# Altium integrated library WCAP-FTXX_rev15a.intlib: 100 symbols (continued)
## WCAP-FTXX 15x18x12x6 890334025022
designator C?, comment 150000 pF
WCAP-FTXX Film Capacitors, C=150000 pF; Manufacturer: Wurth Elektronik; partNo: 890334025022; E-mail: libraries@we-online.com; ComponentLink1Description: Manufacturer; ComponentLink1URL: http://www.we-online.com; ComponentLink2Description: Datasheet; ComponentLink2URL: http://katalog.we-online.de/pbs/datasheet/890334025022.pdf; Created by: Karrer Zheng; Created Date: 3/2/2015; Capacitance: 150000 pF
footprint WCAP-FTXX 15x18x12x6
pins: 1  , 2  

## WCAP-FTXX 15x18x12x6 890334025025
designator C?, comment 180000 pF
WCAP-FTXX Film Capacitors, C=180000 pF; Manufacturer: Wurth Elektronik; partNo: 890334025025; E-mail: libraries@we-online.com; ComponentLink1Description: Manufacturer; ComponentLink1URL: http://www.we-online.com; ComponentLink2Description: Datasheet; ComponentLink2URL: http://katalog.we-online.de/pbs/datasheet/890334025025.pdf; Created by: Karrer Zheng; Created Date: 3/2/2015; Capacitance: 180000 pF
footprint WCAP-FTXX 15x18x12x6
pins: 1  , 2  

## WCAP-FTXX 15x18x13,5x7,5 890334025020
designator C?, comment 120000 pF
WCAP-FTXX Film Capacitors, C=120000 pF; Manufacturer: Wurth Elektronik; partNo: 890334025020; E-mail: libraries@we-online.com; ComponentLink1Description: Manufacturer; ComponentLink1URL: http://www.we-online.com; ComponentLink2Description: Datasheet; ComponentLink2URL: http://katalog.we-online.de/pbs/datasheet/890334025020.pdf; Created by: Karrer Zheng; Created Date: 3/2/2015; Capacitance: 120000 pF
footprint WCAP-FTXX 15x18x13,5x7,5
pins: 1  , 2  

## WCAP-FTXX 15x18x14,5x7,5 890334025031
designator C?, comment 270000 pF
WCAP-FTXX Film Capacitors, C=270000 pF; Manufacturer: Wurth Elektronik; partNo: 890334025031; E-mail: libraries@we-online.com; ComponentLink1Description: Manufacturer; ComponentLink1URL: http://www.we-online.com; ComponentLink2Description: Datasheet; ComponentLink2URL: http://katalog.we-online.de/pbs/datasheet/890334025031.pdf; Created by: Karrer Zheng; Created Date: 3/2/2015; Capacitance: 270000 pF
footprint WCAP-FTXX 15x18x14,5x7,5
pins: 1  , 2  

## WCAP-FTXX 15x18x14,5x8,5 890334025034
designator C?, comment 330000 pF
WCAP-FTXX Film Capacitors, C=330000 pF; Manufacturer: Wurth Elektronik; partNo: 890334025034; E-mail: libraries@we-online.com; ComponentLink1Description: Manufacturer; ComponentLink1URL: http://www.we-online.com; ComponentLink2Description: Datasheet; ComponentLink2URL: http://katalog.we-online.de/pbs/datasheet/890334025034.pdf; Created by: Karrer Zheng; Created Date: 3/2/2015; Capacitance: 330000 pF
footprint WCAP-FTXX 15x18x14,5x8,5
pins: 1  , 2  

## WCAP-FTXX 15x18x14x8 890334025039
designator C?, comment 470000 pF
WCAP-FTXX Film Capacitors, C=470000 pF; Manufacturer: Wurth Elektronik; partNo: 890334025039; E-mail: libraries@we-online.com; ComponentLink1Description: Manufacturer; ComponentLink1URL: http://www.we-online.com; ComponentLink2Description: Datasheet; ComponentLink2URL: http://katalog.we-online.de/pbs/datasheet/890334025039.pdf; Created by: Karrer Zheng; Created Date: 3/2/2015; Capacitance: 470000 pF
footprint WCAP-FTXX 15x18x14x8
pins: 1  , 2  

## WCAP-FTXX 15x18x15x9 890334025043
designator C?, comment 560000 pF
WCAP-FTXX Film Capacitors, C=560000 pF; Manufacturer: Wurth Elektronik; partNo: 890334025043; E-mail: libraries@we-online.com; ComponentLink1Description: Manufacturer; ComponentLink1URL: http://www.we-online.com; ComponentLink2Description: Datasheet; ComponentLink2URL: http://katalog.we-online.de/pbs/datasheet/890334025043.pdf; Created by: Karrer Zheng; Created Date: 3/2/2015; Capacitance: 560000 pF
footprint WCAP-FTXX 15x18x15x9
pins: 1  , 2  

## WCAP-FTXX 15x18x16x10 890334025045
designator C?, comment 680000 pF
WCAP-FTXX Film Capacitors, C=680000 pF; Manufacturer: Wurth Elektronik; partNo: 890334025045; E-mail: libraries@we-online.com; ComponentLink1Description: Manufacturer; ComponentLink1URL: http://www.we-online.com; ComponentLink2Description: Datasheet; ComponentLink2URL: http://katalog.we-online.de/pbs/datasheet/890334025045.pdf; Created by: Karrer Zheng; Created Date: 3/2/2015; Capacitance: 680000 pF
footprint WCAP-FTXX 15x18x16x10
pins: 1  , 2  


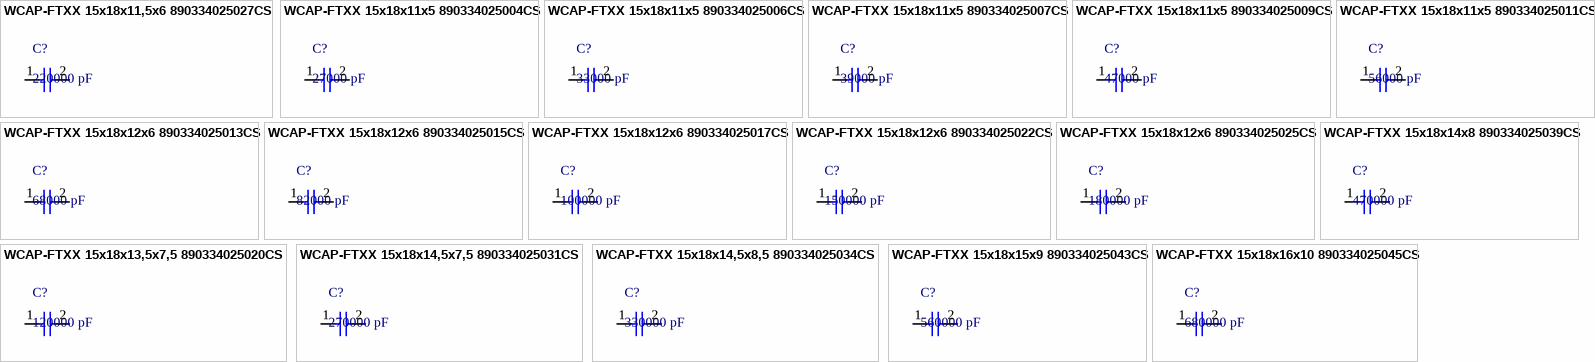
[diagram p5: symbols WCAP-FTXX 15x18x11,5x6 890334025027CS to WCAP-FTXX 15x18x16x10 890334025045CS]

## WCAP-FTXX 15x18x11,5x6 890334025027CS
designator C?, comment 220000 pF
WCAP-FTXX Film Capacitors, C=220000 pF; Manufacturer: Wurth Elektronik; partNo: 890334025027CS; E-mail: libraries@we-online.com; ComponentLink1Description: Manufacturer; ComponentLink1URL: http://www.we-online.com; ComponentLink2Description: Datasheet; ComponentLink2URL: http://katalog.we-online.de/pbs/datasheet/890334025027CS.pdf; Created by: Karrer Zheng; Created Date: 3/2/2015; Capacitance: 220000 pF
footprint WCAP-FTXX 15x18x11,5x6x4
pins: 1  , 2  

## WCAP-FTXX 15x18x11x5 890334025004CS
designator C?, comment 27000 pF
WCAP-FTXX Film Capacitors, C=27000 pF; Manufacturer: Wurth Elektronik; partNo: 890334025004CS; E-mail: libraries@we-online.com; ComponentLink1Description: Manufacturer; ComponentLink1URL: http://www.we-online.com; ComponentLink2Description: Datasheet; ComponentLink2URL: http://katalog.we-online.de/pbs/datasheet/890334025004CS.pdf; Created by: Karrer Zheng; Created Date: 3/2/2015; Capacitance: 27000 pF
footprint WCAP-FTXX 15x18x11x5x4
pins: 1  , 2  

## WCAP-FTXX 15x18x11x5 890334025006CS
designator C?, comment 33000 pF
WCAP-FTXX Film Capacitors, C=33000 pF; Manufacturer: Wurth Elektronik; partNo: 890334025006CS; E-mail: libraries@we-online.com; ComponentLink1Description: Manufacturer; ComponentLink1URL: http://www.we-online.com; ComponentLink2Description: Datasheet; ComponentLink2URL: http://katalog.we-online.de/pbs/datasheet/890334025006CS.pdf; Created by: Karrer Zheng; Created Date: 3/2/2015; Capacitance: 33000 pF
footprint WCAP-FTXX 15x18x11x5x4
pins: 1  , 2  

## WCAP-FTXX 15x18x11x5 890334025007CS
designator C?, comment 39000 pF
WCAP-FTXX Film Capacitors, C=39000 pF; Manufacturer: Wurth Elektronik; partNo: 890334025007CS; E-mail: libraries@we-online.com; ComponentLink1Description: Manufacturer; ComponentLink1URL: http://www.we-online.com; ComponentLink2Description: Datasheet; ComponentLink2URL: http://katalog.we-online.de/pbs/datasheet/890334025007CS.pdf; Created by: Karrer Zheng; Created Date: 3/2/2015; Capacitance: 39000 pF
footprint WCAP-FTXX 15x18x11x5x4
pins: 1  , 2  

## WCAP-FTXX 15x18x11x5 890334025009CS
designator C?, comment 47000 pF
WCAP-FTXX Film Capacitors, C=47000 pF; Manufacturer: Wurth Elektronik; partNo: 890334025009CS; E-mail: libraries@we-online.com; ComponentLink1Description: Manufacturer; ComponentLink1URL: http://www.we-online.com; ComponentLink2Description: Datasheet; ComponentLink2URL: http://katalog.we-online.de/pbs/datasheet/890334025009CS.pdf; Created by: Karrer Zheng; Created Date: 3/2/2015; Capacitance: 47000 pF
footprint WCAP-FTXX 15x18x11x5x4
pins: 1  , 2  

## WCAP-FTXX 15x18x11x5 890334025011CS
designator C?, comment 56000 pF
WCAP-FTXX Film Capacitors, C=56000 pF; Manufacturer: Wurth Elektronik; partNo: 890334025011CS; E-mail: libraries@we-online.com; ComponentLink1Description: Manufacturer; ComponentLink1URL: http://www.we-online.com; ComponentLink2Description: Datasheet; ComponentLink2URL: http://katalog.we-online.de/pbs/datasheet/890334025011CS.pdf; Created by: Karrer Zheng; Created Date: 3/2/2015; Capacitance: 56000 pF
footprint WCAP-FTXX 15x18x11x5x4
pins: 1  , 2  

## WCAP-FTXX 15x18x12x6 890334025013CS
designator C?, comment 68000 pF
WCAP-FTXX Film Capacitors, C=68000 pF; Manufacturer: Wurth Elektronik; partNo: 890334025013CS; E-mail: libraries@we-online.com; ComponentLink1Description: Manufacturer; ComponentLink1URL: http://www.we-online.com; ComponentLink2Description: Datasheet; ComponentLink2URL: http://katalog.we-online.de/pbs/datasheet/890334025013CS.pdf; Created by: Karrer Zheng; Created Date: 3/2/2015; Capacitance: 68000 pF
footprint WCAP-FTXX 15x18x12x6x4
pins: 1  , 2  

## WCAP-FTXX 15x18x12x6 890334025015CS
designator C?, comment 82000 pF
WCAP-FTXX Film Capacitors, C=82000 pF; Manufacturer: Wurth Elektronik; partNo: 890334025015CS; E-mail: libraries@we-online.com; ComponentLink1Description: Manufacturer; ComponentLink1URL: http://www.we-online.com; ComponentLink2Description: Datasheet; ComponentLink2URL: http://katalog.we-online.de/pbs/datasheet/890334025015CS.pdf; Created by: Karrer Zheng; Created Date: 3/2/2015; Capacitance: 82000 pF
footprint WCAP-FTXX 15x18x12x6x4
pins: 1  , 2  

## WCAP-FTXX 15x18x12x6 890334025017CS
designator C?, comment 100000 pF
WCAP-FTXX Film Capacitors, C=100000 pF; Manufacturer: Wurth Elektronik; partNo: 890334025017CS; E-mail: libraries@we-online.com; ComponentLink1Description: Manufacturer; ComponentLink1URL: http://www.we-online.com; ComponentLink2Description: Datasheet; ComponentLink2URL: http://katalog.we-online.de/pbs/datasheet/890334025017CS.pdf; Created by: Karrer Zheng; Created Date: 3/2/2015; Capacitance: 100000 pF
footprint WCAP-FTXX 15x18x12x6x4
pins: 1  , 2  

## WCAP-FTXX 15x18x12x6 890334025022CS
designator C?, comment 150000 pF
WCAP-FTXX Film Capacitors, C=150000 pF; Manufacturer: Wurth Elektronik; partNo: 890334025022CS; E-mail: libraries@we-online.com; ComponentLink1Description: Manufacturer; ComponentLink1URL: http://www.we-online.com; ComponentLink2Description: Datasheet; ComponentLink2URL: http://katalog.we-online.de/pbs/datasheet/890334025022CS.pdf; Created by: Karrer Zheng; Created Date: 3/2/2015; Capacitance: 150000 pF
footprint WCAP-FTXX 15x18x12x6x4
pins: 1  , 2  

## WCAP-FTXX 15x18x12x6 890334025025CS
designator C?, comment 180000 pF
WCAP-FTXX Film Capacitors, C=180000 pF; Manufacturer: Wurth Elektronik; partNo: 890334025025CS; E-mail: libraries@we-online.com; ComponentLink1Description: Manufacturer; ComponentLink1URL: http://www.we-online.com; ComponentLink2Description: Datasheet; ComponentLink2URL: http://katalog.we-online.de/pbs/datasheet/890334025025CS.pdf; Created by: Karrer Zheng; Created Date: 3/2/2015; Capacitance: 180000 pF
footprint WCAP-FTXX 15x18x12x6x4
pins: 1  , 2  

## WCAP-FTXX 15x18x13,5x7,5 890334025020CS
designator C?, comment 120000 pF
WCAP-FTXX Film Capacitors, C=120000 pF; Manufacturer: Wurth Elektronik; partNo: 890334025020CS; E-mail: libraries@we-online.com; ComponentLink1Description: Manufacturer; ComponentLink1URL: http://www.we-online.com; ComponentLink2Description: Datasheet; ComponentLink2URL: http://katalog.we-online.de/pbs/datasheet/890334025020CS.pdf; Created by: Karrer Zheng; Created Date: 3/2/2015; Capacitance: 120000 pF
footprint WCAP-FTXX 15x18x13,5x7,5x4
pins: 1  , 2  

## WCAP-FTXX 15x18x14,5x7,5 890334025031CS
designator C?, comment 270000 pF
WCAP-FTXX Film Capacitors, C=270000 pF; Manufacturer: Wurth Elektronik; partNo: 890334025031CS; E-mail: libraries@we-online.com; ComponentLink1Description: Manufacturer; ComponentLink1URL: http://www.we-online.com; ComponentLink2Description: Datasheet; ComponentLink2URL: http://katalog.we-online.de/pbs/datasheet/890334025031CS.pdf; Created by: Karrer Zheng; Created Date: 3/2/2015; Capacitance: 270000 pF
footprint WCAP-FTXX 15x18x14,5x7,5x4
pins: 1  , 2  

## WCAP-FTXX 15x18x14,5x8,5 890334025034CS
designator C?, comment 330000 pF
WCAP-FTXX Film Capacitors, C=330000 pF; Manufacturer: Wurth Elektronik; partNo: 890334025034CS; E-mail: libraries@we-online.com; ComponentLink1Description: Manufacturer; ComponentLink1URL: http://www.we-online.com; ComponentLink2Description: Datasheet; ComponentLink2URL: http://katalog.we-online.de/pbs/datasheet/890334025034CS.pdf; Created by: Karrer Zheng; Created Date: 3/2/2015; Capacitance: 330000 pF
footprint WCAP-FTXX 15x18x14,5x8,5x4
pins: 1  , 2  

## WCAP-FTXX 15x18x14x8 890334025039CS
designator C?, comment 470000 pF
WCAP-FTXX Film Capacitors, C=470000 pF; Manufacturer: Wurth Elektronik; partNo: 890334025039CS; E-mail: libraries@we-online.com; ComponentLink1Description: Manufacturer; ComponentLink1URL: http://www.we-online.com; ComponentLink2Description: Datasheet; ComponentLink2URL: http://katalog.we-online.de/pbs/datasheet/890334025039CS.pdf; Created by: Karrer Zheng; Created Date: 3/2/2015; Capacitance: 470000 pF
footprint WCAP-FTXX 15x18x14x8x4
pins: 1  , 2  

## WCAP-FTXX 15x18x15x9 890334025043CS
designator C?, comment 560000 pF
WCAP-FTXX Film Capacitors, C=560000 pF; Manufacturer: Wurth Elektronik; partNo: 890334025043CS; E-mail: libraries@we-online.com; ComponentLink1Description: Manufacturer; ComponentLink1URL: http://www.we-online.com; ComponentLink2Description: Datasheet; ComponentLink2URL: http://katalog.we-online.de/pbs/datasheet/890334025043CS.pdf; Created by: Karrer Zheng; Created Date: 3/2/2015; Capacitance: 560000 pF
footprint WCAP-FTXX 15x18x15x9x4
pins: 1  , 2  

## WCAP-FTXX 15x18x16x10 890334025045CS
designator C?, comment 680000 pF
WCAP-FTXX Film Capacitors, C=680000 pF; Manufacturer: Wurth Elektronik; partNo: 890334025045CS; E-mail: libraries@we-online.com; ComponentLink1Description: Manufacturer; ComponentLink1URL: http://www.we-online.com; ComponentLink2Description: Datasheet; ComponentLink2URL: http://katalog.we-online.de/pbs/datasheet/890334025045CS.pdf; Created by: Karrer Zheng; Created Date: 3/2/2015; Capacitance: 680000 pF
footprint WCAP-FTXX 15x18x16x10x4
pins: 1  , 2  


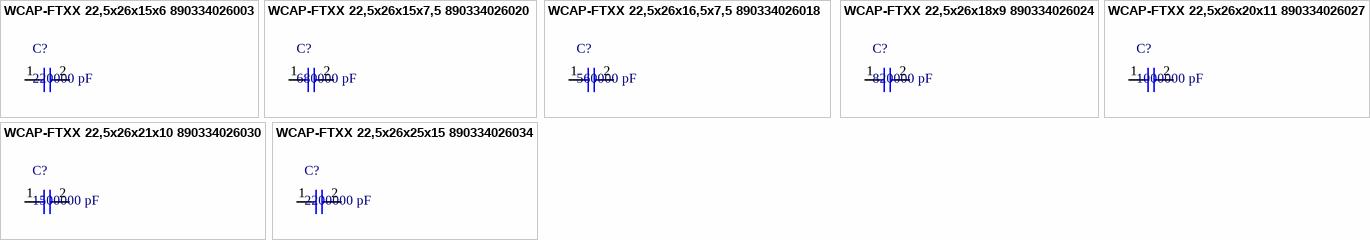
[diagram p6: symbols WCAP-FTXX 22,5x26x15x6 890334026003 to WCAP-FTXX 22,5x26x25x15 890334026034]

## WCAP-FTXX 22,5x26x15x6 890334026003
designator C?, comment 220000 pF
WCAP-FTXX Film Capacitors, C=220000 pF; Manufacturer: Wurth Elektronik; partNo: 890334026003; E-mail: libraries@we-online.com; ComponentLink1Description: Manufacturer; ComponentLink1URL: http://www.we-online.com; ComponentLink2Description: Datasheet; ComponentLink2URL: http://katalog.we-online.de/pbs/datasheet/890334026003.pdf; Created by: Karrer Zheng; Created Date: 3/2/2015; Capacitance: 220000 pF
footprint WCAP-FTXX 22,5x26x15x6
pins: 1  , 2  

## WCAP-FTXX 22,5x26x15x7,5 890334026020
designator C?, comment 680000 pF
WCAP-FTXX Film Capacitors, C=680000 pF; Manufacturer: Wurth Elektronik; partNo: 890334026020; E-mail: libraries@we-online.com; ComponentLink1Description: Manufacturer; ComponentLink1URL: http://www.we-online.com; ComponentLink2Description: Datasheet; ComponentLink2URL: http://katalog.we-online.de/pbs/datasheet/890334026020.pdf; Created by: Karrer Zheng; Created Date: 3/2/2015; Capacitance: 680000 pF
footprint WCAP-FTXX 22,5x26x15x7,5
pins: 1  , 2  

## WCAP-FTXX 22,5x26x16,5x7,5 890334026018
designator C?, comment 560000 pF
WCAP-FTXX Film Capacitors, C=560000 pF; Manufacturer: Wurth Elektronik; partNo: 890334026018; E-mail: libraries@we-online.com; ComponentLink1Description: Manufacturer; ComponentLink1URL: http://www.we-online.com; ComponentLink2Description: Datasheet; ComponentLink2URL: http://katalog.we-online.de/pbs/datasheet/890334026018.pdf; Created by: Karrer Zheng; Created Date: 3/2/2015; Capacitance: 560000 pF
footprint WCAP-FTXX 22,5x26x16,5x7,5
pins: 1  , 2  

## WCAP-FTXX 22,5x26x18x9 890334026024
designator C?, comment 820000 pF
WCAP-FTXX Film Capacitors, C=820000 pF; Manufacturer: Wurth Elektronik; partNo: 890334026024; E-mail: libraries@we-online.com; ComponentLink1Description: Manufacturer; ComponentLink1URL: http://www.we-online.com; ComponentLink2Description: Datasheet; ComponentLink2URL: http://katalog.we-online.de/pbs/datasheet/890334026024.pdf; Created by: Karrer Zheng; Created Date: 3/2/2015; Capacitance: 820000 pF
footprint WCAP-FTXX 22,5x26x18x9
pins: 1  , 2  

## WCAP-FTXX 22,5x26x20x11 890334026027
designator C?, comment 1000000 pF
WCAP-FTXX Film Capacitors, C=1000000 pF; Manufacturer: Wurth Elektronik; partNo: 890334026027; E-mail: libraries@we-online.com; ComponentLink1Description: Manufacturer; ComponentLink1URL: http://www.we-online.com; ComponentLink2Description: Datasheet; ComponentLink2URL: http://katalog.we-online.de/pbs/datasheet/890334026027.pdf; Created by: Karrer Zheng; Created Date: 3/2/2015; Capacitance: 1000000 pF
footprint WCAP-FTXX 22,5x26x20x11
pins: 1  , 2  

## WCAP-FTXX 22,5x26x21x10 890334026030
designator C?, comment 1500000 pF
WCAP-FTXX Film Capacitors, C=1500000 pF; Manufacturer: Wurth Elektronik; partNo: 890334026030; E-mail: libraries@we-online.com; ComponentLink1Description: Manufacturer; ComponentLink1URL: http://www.we-online.com; ComponentLink2Description: Datasheet; ComponentLink2URL: http://katalog.we-online.de/pbs/datasheet/890334026030.pdf; Created by: Karrer Zheng; Created Date: 3/2/2015; Capacitance: 1500000 pF
footprint WCAP-FTXX 22,5x26x21x10
pins: 1  , 2  

## WCAP-FTXX 22,5x26x25x15 890334026034
designator C?, comment 2200000 pF
WCAP-FTXX Film Capacitors, C=2200000 pF; Manufacturer: Wurth Elektronik; partNo: 890334026034; E-mail: libraries@we-online.com; ComponentLink1Description: Manufacturer; ComponentLink1URL: http://www.we-online.com; ComponentLink2Description: Datasheet; ComponentLink2URL: http://katalog.we-online.de/pbs/datasheet/890334026034.pdf; Created by: Karrer Zheng; Created Date: 3/2/2015; Capacitance: 2200000 pF
footprint WCAP-FTXX 22,5x26x25x15
pins: 1  , 2  


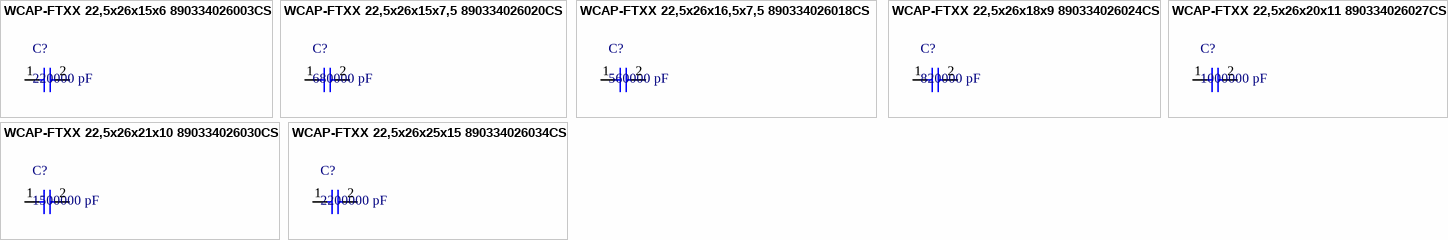
[diagram p7: symbols WCAP-FTXX 22,5x26x15x6 890334026003CS to WCAP-FTXX 22,5x26x25x15 890334026034CS]

## WCAP-FTXX 22,5x26x15x6 890334026003CS
designator C?, comment 220000 pF
WCAP-FTXX Film Capacitors, C=220000 pF; Manufacturer: Wurth Elektronik; partNo: 890334026003CS; E-mail: libraries@we-online.com; ComponentLink1Description: Manufacturer; ComponentLink1URL: http://www.we-online.com; ComponentLink2Description: Datasheet; ComponentLink2URL: http://katalog.we-online.de/pbs/datasheet/890334026003CS.pdf; Created by: Karrer Zheng; Created Date: 3/2/2015; Capacitance: 220000 pF
footprint WCAP-FTXX 22,5x26x15x6x4
pins: 1  , 2  

## WCAP-FTXX 22,5x26x15x7,5 890334026020CS
designator C?, comment 680000 pF
WCAP-FTXX Film Capacitors, C=680000 pF; Manufacturer: Wurth Elektronik; partNo: 890334026020CS; E-mail: libraries@we-online.com; ComponentLink1Description: Manufacturer; ComponentLink1URL: http://www.we-online.com; ComponentLink2Description: Datasheet; ComponentLink2URL: http://katalog.we-online.de/pbs/datasheet/890334026020CS.pdf; Created by: Karrer Zheng; Created Date: 3/2/2015; Capacitance: 680000 pF
footprint WCAP-FTXX 22,5x26x15x7,5x4
pins: 1  , 2  

## WCAP-FTXX 22,5x26x16,5x7,5 890334026018CS
designator C?, comment 560000 pF
WCAP-FTXX Film Capacitors, C=560000 pF; Manufacturer: Wurth Elektronik; partNo: 890334026018CS; E-mail: libraries@we-online.com; ComponentLink1Description: Manufacturer; ComponentLink1URL: http://www.we-online.com; ComponentLink2Description: Datasheet; ComponentLink2URL: http://katalog.we-online.de/pbs/datasheet/890334026018CS.pdf; Created by: Karrer Zheng; Created Date: 3/2/2015; Capacitance: 560000 pF
footprint WCAP-FTXX 22,5x26x16,5x7,5x4
pins: 1  , 2  

## WCAP-FTXX 22,5x26x18x9 890334026024CS
designator C?, comment 820000 pF
WCAP-FTXX Film Capacitors, C=820000 pF; Manufacturer: Wurth Elektronik; partNo: 890334026024CS; E-mail: libraries@we-online.com; ComponentLink1Description: Manufacturer; ComponentLink1URL: http://www.we-online.com; ComponentLink2Description: Datasheet; ComponentLink2URL: http://katalog.we-online.de/pbs/datasheet/890334026024CS.pdf; Created by: Karrer Zheng; Created Date: 3/2/2015; Capacitance: 820000 pF
footprint WCAP-FTXX 22,5x26x18x9x4
pins: 1  , 2  

## WCAP-FTXX 22,5x26x20x11 890334026027CS
designator C?, comment 1000000 pF
WCAP-FTXX Film Capacitors, C=1000000 pF; Manufacturer: Wurth Elektronik; partNo: 890334026027CS; E-mail: libraries@we-online.com; ComponentLink1Description: Manufacturer; ComponentLink1URL: http://www.we-online.com; ComponentLink2Description: Datasheet; ComponentLink2URL: http://katalog.we-online.de/pbs/datasheet/890334026027CS.pdf; Created by: Karrer Zheng; Created Date: 3/2/2015; Capacitance: 1000000 pF
footprint WCAP-FTXX 22,5x26x20x11x4
pins: 1  , 2  

## WCAP-FTXX 22,5x26x21x10 890334026030CS
designator C?, comment 1500000 pF
WCAP-FTXX Film Capacitors, C=1500000 pF; Manufacturer: Wurth Elektronik; partNo: 890334026030CS; E-mail: libraries@we-online.com; ComponentLink1Description: Manufacturer; ComponentLink1URL: http://www.we-online.com; ComponentLink2Description: Datasheet; ComponentLink2URL: http://katalog.we-online.de/pbs/datasheet/890334026030CS.pdf; Created by: Karrer Zheng; Created Date: 3/2/2015; Capacitance: 1500000 pF
footprint WCAP-FTXX 22,5x26x21x10x4
pins: 1  , 2  

## WCAP-FTXX 22,5x26x25x15 890334026034CS
designator C?, comment 2200000 pF
WCAP-FTXX Film Capacitors, C=2200000 pF; Manufacturer: Wurth Elektronik; partNo: 890334026034CS; E-mail: libraries@we-online.com; ComponentLink1Description: Manufacturer; ComponentLink1URL: http://www.we-online.com; ComponentLink2Description: Datasheet; ComponentLink2URL: http://katalog.we-online.de/pbs/datasheet/890334026034CS.pdf; Created by: Karrer Zheng; Created Date: 3/2/2015; Capacitance: 2200000 pF
footprint WCAP-FTXX 22,5x26x25x15x4
pins: 1  , 2  


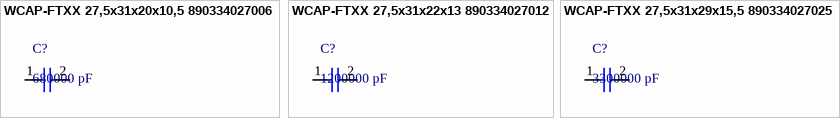
[diagram p8: symbols WCAP-FTXX 27,5x31x20x10,5 890334027006 to WCAP-FTXX 27,5x31x29x15,5 890334027025]

## WCAP-FTXX 27,5x31x20x10,5 890334027006
designator C?, comment 680000 pF
WCAP-FTXX Film Capacitors, C=680000 pF; Manufacturer: Wurth Elektronik; partNo: 890334027006; E-mail: libraries@we-online.com; ComponentLink1Description: Manufacturer; ComponentLink1URL: http://www.we-online.com; ComponentLink2Description: Datasheet; ComponentLink2URL: http://katalog.we-online.de/pbs/datasheet/890334027006.pdf; Created by: Karrer Zheng; Created Date: 3/2/2015; Capacitance: 680000 pF
footprint WCAP-FTXX 27,5x31x20x10,5
pins: 1  , 2  

## WCAP-FTXX 27,5x31x22x13 890334027012
designator C?, comment 1200000 pF
WCAP-FTXX Film Capacitors, C=1200000 pF; Manufacturer: Wurth Elektronik; partNo: 890334027012; E-mail: libraries@we-online.com; ComponentLink1Description: Manufacturer; ComponentLink1URL: http://www.we-online.com; ComponentLink2Description: Datasheet; ComponentLink2URL: http://katalog.we-online.de/pbs/datasheet/890334027012.pdf; Created by: Karrer Zheng; Created Date: 3/2/2015; Capacitance: 1200000 pF
footprint WCAP-FTXX 27,5x31x22x13
pins: 1  , 2  

## WCAP-FTXX 27,5x31x29x15,5 890334027025
designator C?, comment 3300000 pF
WCAP-FTXX Film Capacitors, C=3300000 pF; Manufacturer: Wurth Elektronik; partNo: 890334027025; E-mail: libraries@we-online.com; ComponentLink1Description: Manufacturer; ComponentLink1URL: http://www.we-online.com; ComponentLink2Description: Datasheet; ComponentLink2URL: http://katalog.we-online.de/pbs/datasheet/890334027025.pdf; Created by: Karrer Zheng; Created Date: 3/2/2015; Capacitance: 3300000 pF
footprint WCAP-FTXX 27,5x31x29x15,5
pins: 1  , 2  


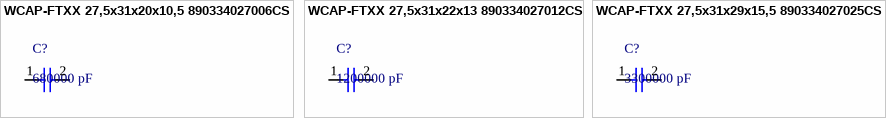
[diagram p9: symbols WCAP-FTXX 27,5x31x20x10,5 890334027006CS to WCAP-FTXX 27,5x31x29x15,5 890334027025CS]

## WCAP-FTXX 27,5x31x20x10,5 890334027006CS
designator C?, comment 680000 pF
WCAP-FTXX Film Capacitors, C=680000 pF; Manufacturer: Wurth Elektronik; partNo: 890334027006CS; E-mail: libraries@we-online.com; ComponentLink1Description: Manufacturer; ComponentLink1URL: http://www.we-online.com; ComponentLink2Description: Datasheet; ComponentLink2URL: http://katalog.we-online.de/pbs/datasheet/890334027006CS.pdf; Created by: Karrer Zheng; Created Date: 3/2/2015; Capacitance: 680000 pF
footprint WCAP-FTXX 27,5x31x20x10,5x4
pins: 1  , 2  

## WCAP-FTXX 27,5x31x22x13 890334027012CS
designator C?, comment 1200000 pF
WCAP-FTXX Film Capacitors, C=1200000 pF; Manufacturer: Wurth Elektronik; partNo: 890334027012CS; E-mail: libraries@we-online.com; ComponentLink1Description: Manufacturer; ComponentLink1URL: http://www.we-online.com; ComponentLink2Description: Datasheet; ComponentLink2URL: http://katalog.we-online.de/pbs/datasheet/890334027012CS.pdf; Created by: Karrer Zheng; Created Date: 3/2/2015; Capacitance: 1200000 pF
footprint WCAP-FTXX 27,5x31x22x13x4
pins: 1  , 2  

## WCAP-FTXX 27,5x31x29x15,5 890334027025CS
designator C?, comment 3300000 pF
WCAP-FTXX Film Capacitors, C=3300000 pF; Manufacturer: Wurth Elektronik; partNo: 890334027025CS; E-mail: libraries@we-online.com; ComponentLink1Description: Manufacturer; ComponentLink1URL: http://www.we-online.com; ComponentLink2Description: Datasheet; ComponentLink2URL: http://katalog.we-online.de/pbs/datasheet/890334027025CS.pdf; Created by: Karrer Zheng; Created Date: 3/2/2015; Capacitance: 3300000 pF
footprint WCAP-FTXX 27,5x31x29x15,5x4
pins: 1  , 2  


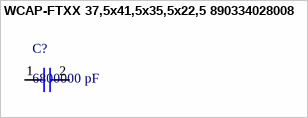
[diagram p10: symbol WCAP-FTXX 37,5x41,5x35,5x22,5 890334028008]

## WCAP-FTXX 37,5x41,5x35,5x22,5 890334028008
designator C?, comment 6800000 pF
WCAP-FTXX Film Capacitors, C=6800000 pF; Manufacturer: Wurth Elektronik; partNo: 890334028008; E-mail: libraries@we-online.com; ComponentLink1Description: Manufacturer; ComponentLink1URL: http://www.we-online.com; ComponentLink2Description: Datasheet; ComponentLink2URL: http://katalog.we-online.de/pbs/datasheet/890334028008.pdf; Created by: Karrer Zheng; Created Date: 3/2/2015; Capacitance: 6800000 pF
footprint WCAP-FTXX 37,5x41,5x35,5x22,5
pins: 1  , 2  


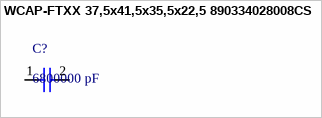
[diagram p11: symbol WCAP-FTXX 37,5x41,5x35,5x22,5 890334028008CS]

## WCAP-FTXX 37,5x41,5x35,5x22,5 890334028008CS
designator C?, comment 6800000 pF
WCAP-FTXX Film Capacitors, C=6800000 pF; Manufacturer: Wurth Elektronik; partNo: 890334028008CS; E-mail: libraries@we-online.com; ComponentLink1Description: Manufacturer; ComponentLink1URL: http://www.we-online.com; ComponentLink2Description: Datasheet; ComponentLink2URL: http://katalog.we-online.de/pbs/datasheet/890334028008CS.pdf; Created by: Karrer Zheng; Created Date: 3/2/2015; Capacitance: 6800000 pF
footprint WCAP-FTXX 37,5x41,5x35,5x22,5x4
pins: 1  , 2  


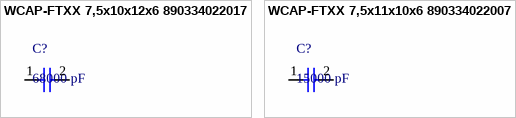
[diagram p12: symbols WCAP-FTXX 7,5x10x12x6 890334022017 to WCAP-FTXX 7,5x11x10x6 890334022007]

## WCAP-FTXX 7,5x10x12x6 890334022017
designator C?, comment 68000 pF
WCAP-FTXX Film Capacitors, C=68000 pF; Manufacturer: Wurth Elektronik; partNo: 890334022017; E-mail: libraries@we-online.com; ComponentLink1Description: Manufacturer; ComponentLink1URL: http://www.we-online.com; ComponentLink2Description: Datasheet; ComponentLink2URL: http://katalog.we-online.de/pbs/datasheet/890334022017.pdf; Created by: Karrer Zheng; Created Date: 3/2/2015; Capacitance: 68000 pF
footprint WCAP-FTXX 7,5x10x12x6
pins: 1  , 2  

## WCAP-FTXX 7,5x11x10x6 890334022007
designator C?, comment 15000 pF
WCAP-FTXX Film Capacitors, C=15000 pF; Manufacturer: Wurth Elektronik; partNo: 890334022007; E-mail: libraries@we-online.com; ComponentLink1Description: Manufacturer; ComponentLink1URL: http://www.we-online.com; ComponentLink2Description: Datasheet; ComponentLink2URL: http://katalog.we-online.de/pbs/datasheet/890334022007.pdf; Created by: Karrer Zheng; Created Date: 3/2/2015; Capacitance: 15000 pF
footprint WCAP-FTXX 7,5x11x10x6
pins: 1  , 2  


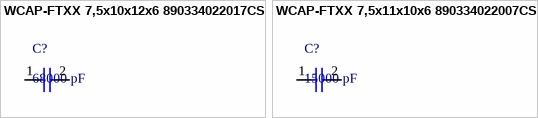
[diagram p13: symbols WCAP-FTXX 7,5x10x12x6 890334022017CS to WCAP-FTXX 7,5x11x10x6 890334022007CS]

## WCAP-FTXX 7,5x10x12x6 890334022017CS
designator C?, comment 68000 pF
WCAP-FTXX Film Capacitors, C=68000 pF; Manufacturer: Wurth Elektronik; partNo: 890334022017CS; E-mail: libraries@we-online.com; ComponentLink1Description: Manufacturer; ComponentLink1URL: http://www.we-online.com; ComponentLink2Description: Datasheet; ComponentLink2URL: http://katalog.we-online.de/pbs/datasheet/890334022017CS.pdf; Created by: Karrer Zheng; Created Date: 3/2/2015; Capacitance: 68000 pF
footprint WCAP-FTXX 7,5x10x12x6x4
pins: 1  , 2  

## WCAP-FTXX 7,5x11x10x6 890334022007CS
designator C?, comment 15000 pF
WCAP-FTXX Film Capacitors, C=15000 pF; Manufacturer: Wurth Elektronik; partNo: 890334022007CS; E-mail: libraries@we-online.com; ComponentLink1Description: Manufacturer; ComponentLink1URL: http://www.we-online.com; ComponentLink2Description: Datasheet; ComponentLink2URL: http://katalog.we-online.de/pbs/datasheet/890334022007CS.pdf; Created by: Karrer Zheng; Created Date: 3/2/2015; Capacitance: 15000 pF
footprint WCAP-FTXX 7,5x11x10x6x4
pins: 1  , 2  